# Altium schematic symbol library SCHLIB.SchLib: 2608 symbols (part 20 of 20) (continued)
## TVS-SMBJ33CA-SMB (continued)
footprint D-SMB-DO214AA-CA
pins: A I/O1, C I/O2

## TVS-SMBJ60A
designator TVS?, comment SMBJ60A  Clamping Voltage: 96.8V  Case/Package: SMB
TVS DIODE 60V 96.8V DO214AA; Manufacturer: Littelfuse; Manufacturer Part Number 1: SMBJ6.0A; Peak Pulse Power: 600W; Polarity: Unidirectional; Peak Pulse Current: 6.2A; Test Current: 10mA; Breakdown Voltage: 66.7V; Number of Elements: 1; Leakage Current: 1uA; Min Breakdown Voltage: 6.67V; Max Reverse Leakage Current: 800uA; Element Configuration: Single; Max Power Dissipation: 5W; Max Breakdown Voltage: 7.37V; Power Line Protection: No; Voltage Rating (DC): 6V; Supplier 1: Mouser; Stock 1: 8672; Pricing 1: 1=0,45000, 10=0,19300, 100=0,13000, 1000=0,12600, 3000=0,12500, 9000=0,12500 (USD); RoHS: Yes; Mount: Surface Mount; Number of Pins: 2; Min Operating Temperature: -65°C; Max Operating Temperature: 150°C; Reverse Standoff Voltage: 60V; Packaging: Tape and Reel; Max Surge Current: 6.2A; Package Quantity: 3000; Reverse Breakdown Voltage: 66.7V; Operating Supply Voltage: 60V; Number of Channels: 1; Direction: Unidirectional; Termination: SMD/SMT; Power Dissipation: 600W; Number of Unidirectional Channels: 1; Resistor Type: Zener; Length: 4.57mm; Height: 2.237mm; Width: 3.94mm; Radiation Hardening: No; Lead Free: Lead Free; REACH SVHC: No SVHC; ComponentLink1URL: https://datasheet.ciiva.com/5771/littelfuse-tvs-diode-smbj-5771072.pdf?src-supplier=Farnell; ComponentLink1Description: https://datasheet.ciiva.com/5771/littelfuse-tvs-diode-smbj-5771072.pdf?src-supplier=Farnell; ComponentLink2URL: https://datasheet.ciiva.com/25624/0900766b810f4eeb-25624708.pdf?src-supplier=RSComponents; ComponentLink2Description: https://datasheet.ciiva.com/25624/0900766b810f4eeb-25624708.pdf?src-supplier=RSComponents; ComponentLink3URL: https://datasheet.ciiva.com/15143/getdatasheetpartid-121100-15143582.pdf?src-supplier=Verical; ComponentLink3Description: https://datasheet.ciiva.com/15143/getdatasheetpartid-121100-15143582.pdf?src-supplier=Verical; ComponentLink4URL: https://datasheet.ciiva.com/331/littelfuse-tvs-diode-smbj-datasheet-pdf-331140.pdf?src-supplier=Digi-Key; ComponentLink4Description: https://datasheet.ciiva.com/331/littelfuse-tvs-diode-smbj-datasheet-pdf-331140.pdf?src-supplier=Digi-Key; ComponentLink5URL: https://datasheet.ciiva.com/331/littelfuse-tvs-diode-smbj-datasheet-pdf-331142.pdf?src-supplier=Digi-Key; ComponentLink5Description: https://datasheet.ciiva.com/331/littelfuse-tvs-diode-smbj-datasheet-pdf-331142.pdf?src-supplier=Digi-Key; ComponentLink6URL: https://datasheet.ciiva.com/331/littelfuse-tvs-diode-smbj-datasheet-pdf-331302.pdf?src-supplier=Digi-Key; ComponentLink6Description: https://datasheet.ciiva.com/331/littelfuse-tvs-diode-smbj-datasheet-pdf-331302.pdf?src-supplier=Digi-Key; ComponentLink7URL: https://datasheet.ciiva.com/331/littelfuse-tvs-diode-smbj-datasheet-pdf-331303.pdf?src-supplier=Digi-Key; ComponentLink7Description: https://datasheet.ciiva.com/331/littelfuse-tvs-diode-smbj-datasheet-pdf-331303.pdf?src-supplier=Digi-Key; ComponentLink8URL: https://datasheet.ciiva.com/8062/13057-8062551.pdf?src-supplier=Element14; ComponentLink8Description: https://datasheet.ciiva.com/8062/13057-8062551.pdf?src-supplier=Element14; ComponentLink9URL: https://datasheet.ciiva.com/16389/littelfuse-tvs-diode-smbj-16389079.pdf?src-supplier=Future+Electronics; ComponentLink9Description: https://datasheet.ciiva.com/16389/littelfuse-tvs-diode-smbj-16389079.pdf?src-supplier=Future+Electronics; ComponentLink10URL: https://datasheet.ciiva.com/331/littelfuse-tvs-diode-smbj-datasheet-pdf-331304.pdf?src-supplier=Digi-Key; ComponentLink10Description: https://datasheet.ciiva.com/331/littelfuse-tvs-diode-smbj-datasheet-pdf-331304.pdf?src-supplier=Digi-Key; ComponentLink11URL: https://datasheet.ciiva.com/16395/littelfuse-tvs-diode-smbj-16395752.pdf?src-supplier=Future+Electronics; ComponentLink11Description: https://datasheet.ciiva.com/16395/littelfuse-tvs-diode-smbj-16395752.pdf?src-supplier=Future+Electronics; ComponentLink12URL: https://datasheet.ciiva.com/8062/littelfuse-tvs-diode-smbj-8062345.pdf?src-supplier=Element14; ComponentLink12Description: https://datasheet.ciiva.com/8062/littelfuse-tvs-diode-smbj-8062345.pdf?src-supplier=Element14; ComponentLink13URL: https://datasheet.ciiva.com/4508/littelfuse-tvs-diode-smbj-48653-4508090.pdf?src-supplier=Mouser; ComponentLink13Description: https://datasheet.ciiva.com/4508/littelfuse-tvs-diode-smbj-48653-4508090.pdf?src-supplier=Mouser; ComponentLink14URL: https://datasheet.ciiva.com/4510/littelfuse-tvs-diode-smbj-48653-4510171.pdf?src-supplier=Mouser; ComponentLink14Description: https://datasheet.ciiva.com/4510/littelfuse-tvs-diode-smbj-48653-4510171.pdf?src-supplier=Mouser; ComponentLink15URL: https://datasheet.ciiva.com/14162/smbj-eng-ds-14162044.pdf?src-supplier=Distrelec; ComponentLink15Description: https://datasheet.ciiva.com/14162/smbj-eng-ds-14162044.pdf?src-supplier=Distrelec; ComponentLink16URL: https://datasheet.ciiva.com/8062/littelfuse-tvs-diode-smbj-8062349.pdf?src-supplier=Element14; ComponentLink16Description: https://datasheet.ciiva.com/8062/littelfuse-tvs-diode-smbj-8062349.pdf?src-supplier=Element14; Supplier Part Number 1: 576-SMBJ6.0A
footprint D-SMB-DO214AA
pins: A, C

## TVS-TPD2E2U06QDCKRQ1
designator TVS?, comment TPD2E2U06
TVS DIODE 5.5V 12.4V SC70-3; Manufacturer: Texas Instruments; Manufacturer Part Number: TPD2E2U06QDCKRQ1; Capacitance: 1.5pF; Interface: LVDS,USB,Ethernet; Number of Channels: 2; Supplier 1: Digi-Key; Supplier Part Number 1: 296-44302-1-ND; Stock: 14322; Pricing: 1=0.61, 10=0.49, 100=0.385, 500=0.266, 1000=0.21 (USD); RoHS: No; Min Operating Temperature: -40°C; Max Operating Temperature: 125°C; Lead Free: Lead Free; ComponentLink1URL: http://www.ti.com/general/docs/suppproductinfo.tsp?distId=10&amp;gotoUrl=http%3A%2F%2Fwww.ti.com%2Flit%2Fgpn%2Ftpd2e2u06-q1&src-supplier=Digi-Key; ComponentLink1Description: http://www.ti.com/general/docs/suppproductinfo.tsp?distId=10&amp;gotoUrl=http%3A%2F%2Fwww.ti.com%2Flit%2Fgpn%2Ftpd2e2u06-q1&src-supplier=Digi-Key; ComponentLink2URL: http://www.ti.com/lit/pdf/sszt035?src-supplier=Digi-Key; ComponentLink2Description: http://www.ti.com/lit/pdf/sszt035?src-supplier=Digi-Key
footprint SOT323-3
pins: 1 I/O1, 2 I/O2, 3 GND

## TVS-TPSMB13CA
designator TVS?  Voltage - Breakdown (Min): 12.4V  Package: DO-214AA, SMB
TVS DIODE 11.1VWM 18.2VC DO214AA; Manufacturer Part Number: TPSMB13CA; Manufacturer: Littelfuse Inc.; Bidirectional Channels: 1; Voltage - Reverse Standoff: 11.1V; Voltage - Clamping (Max) @ Ipp: 18.2V; Current - Peak Pulse (10/1000µs): 33.5A; Power - Peak Pulse: 600W; Power Line Protection: No; Object  Type: Part; Design Item ID: TVS-TPSMB13CA; Series: TPSMB; Type: Zener; Applications: Automotive; Operating Temperature: -65°C ~ 175°C (TJ); Mounting Type: Surface Mount; Category: Diode
footprint DO-214AA-SMB
pins: A I/O1, C I/O2

## TVS-TPSMB15CA
designator TVS?  Voltage - Breakdown (Min): 14.3V  Package: DO-214AA, SMB
TVS DIODE 12.8VWM 21.2VC DO214AA; Manufacturer Part Number: TPSMB15CA; Manufacturer: Littelfuse Inc.; Bidirectional Channels: 1; Voltage - Reverse Standoff: 12.8V; Voltage - Clamping (Max) @ Ipp: 21.2V; Current - Peak Pulse (10/1000µs): 28.8A; Power - Peak Pulse: 600W; Power Line Protection: No; Object  Type: Part; Design Item ID: TVS-TPSMB15CA; Series: TPSMB; Type: Zener; Applications: Automotive; Operating Temperature: -65°C ~ 175°C (TJ); Mounting Type: Surface Mount; Category: Diode
footprint DO-214AA-SMB
pins: A I/O1, C I/O2

## TVS-TPSMB16CA
designator TVS?  Voltage - Breakdown (Min): 15.2V  Package: DO-214AA, SMB
TVS DIODE 13.6VWM 22.5VC DO214AA; Manufacturer Part Number: TPSMB16CA; Manufacturer: Littelfuse Inc.; Bidirectional Channels: 1; Voltage - Reverse Standoff: 13.6V; Voltage - Clamping (Max) @ Ipp: 22.5V; Current - Peak Pulse (10/1000µs): 27.1A; Power - Peak Pulse: 600W; Power Line Protection: No; Object  Type: Part; Design Item ID: TVS-TPSMB16CA; Series: TPSMB; Type: Zener; Applications: Automotive; Operating Temperature: -65°C ~ 175°C (TJ); Mounting Type: Surface Mount; Category: Diode
footprint DO-214AA-SMB
pins: A I/O1, C I/O2

## TVS-TPSMB24CA-VR
designator TVS?  Voltage - Breakdown (Min): 26.7V  Package: DO-214AA, SMB
TVS DIODE 24VWM 38.9VC DO214AA; Manufacturer Part Number: TPSMB24CA-VR; Manufacturer: Littelfuse Inc.; Bidirectional Channels: 1; Voltage - Reverse Standoff: 24V; Voltage - Clamping (Max) @ Ipp: 38.9V; Current - Peak Pulse (10/1000µs): 15.5A; Power - Peak Pulse: 600W; Power Line Protection: No; Object  Type: Part; Design Item ID: TVS-TPSMB24CA-VR; Series: TPSMB-VR; Type: Zener; Applications: Automotive; Operating Temperature: -65°C ~ 175°C (TJ); Mounting Type: Surface Mount; Category: Diode
footprint DO-214AA-SMB
pins: A I/O1, C I/O2

## TVS-TPSMB27CA
designator TVS?  Voltage - Breakdown (Min): 25.7V  Package: DO-214AA, SMB
TVS DIODE 23.1VWM 37.5VC DO214AA; Manufacturer Part Number: TPSMB27CA; Manufacturer: Littelfuse Inc.; Bidirectional Channels: 1; Voltage - Reverse Standoff: 23.1V; Voltage - Clamping (Max) @ Ipp: 37.5V; Current - Peak Pulse (10/1000µs): 16.3A; Power - Peak Pulse: 600W; Power Line Protection: No; Object  Type: Part; Design Item ID: TVS-TPSMB27CA; Series: TPSMB; Type: Zener; Applications: Automotive; Operating Temperature: -65°C ~ 175°C (TJ); Mounting Type: Surface Mount; Category: Diode
footprint DO-214AA-SMB
pins: A I/O1, C I/O2

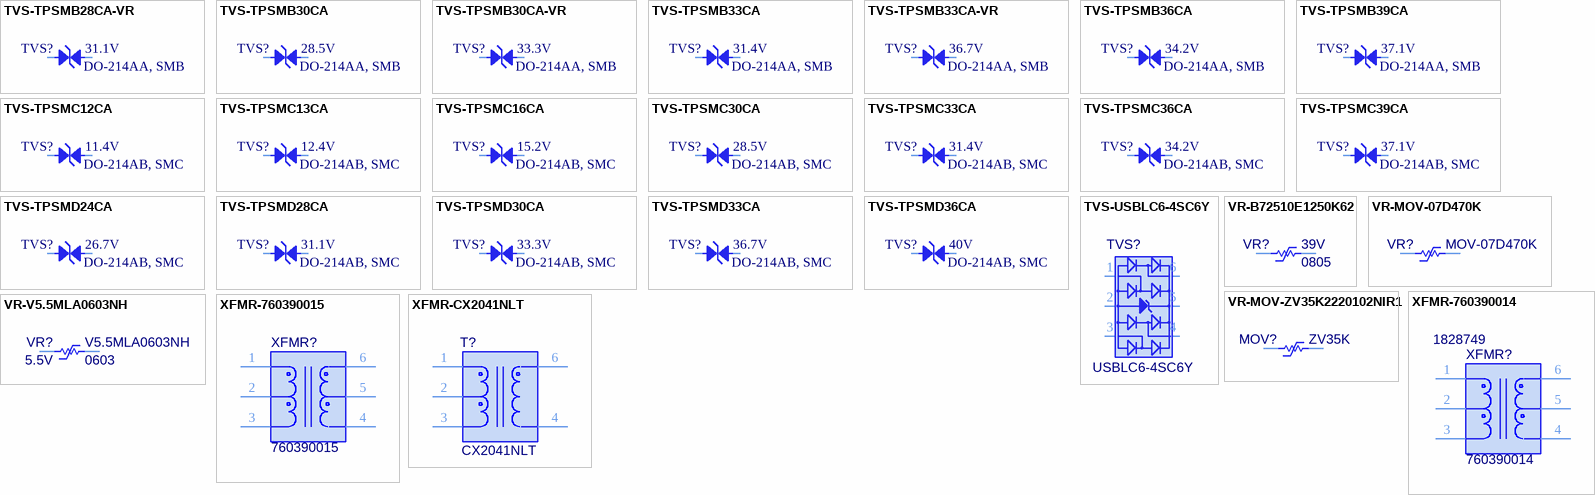
[diagram p83: symbols TVS-TPSMB28CA-VR to XFMR-CX2041NLT]

## TVS-TPSMB28CA-VR
designator TVS?  Voltage - Breakdown (Min): 31.1V  Package: DO-214AA, SMB
TVS DIODE 28VWM 45.4VC DO214 TR; Manufacturer Part Number: TPSMB28CA-VR; Manufacturer: Littelfuse Inc.; Bidirectional Channels: 1; Voltage - Reverse Standoff: 28V; Voltage - Clamping (Max) @ Ipp: 45.4V; Current - Peak Pulse (10/1000µs): 13.3A; Power - Peak Pulse: 600W; Power Line Protection: No; Object  Type: Part; Design Item ID: TVS-TPSMB28CA-VR; Series: TPSMB-VR; Type: Zener; Applications: Automotive; Operating Temperature: -65°C ~ 175°C (TJ); Mounting Type: Surface Mount; Category: Diode
footprint DO-214AA-SMB
pins: A I/O1, C I/O2

## TVS-TPSMB30CA
designator TVS?  Voltage - Breakdown (Min): 28.5V  Package: DO-214AA, SMB
TVS DIODE 25.6VWM 41.4VC DO214AA; Manufacturer Part Number: TPSMB30CA; Manufacturer: Littelfuse Inc.; Bidirectional Channels: 1; Voltage - Reverse Standoff: 25.6V; Voltage - Clamping (Max) @ Ipp: 41.4V; Current - Peak Pulse (10/1000µs): 14.7A; Power - Peak Pulse: 600W; Power Line Protection: No; Object  Type: Part; Design Item ID: TVS-TPSMB30CA; Series: TPSMB; Type: Zener; Applications: Automotive; Operating Temperature: -65°C ~ 175°C (TJ); Mounting Type: Surface Mount; Category: Diode
footprint DO-214AA-SMB
pins: A I/O1, C I/O2

## TVS-TPSMB30CA-VR
designator TVS?  Voltage - Breakdown (Min): 33.3V  Package: DO-214AA, SMB
TVS DIODE 30VWM 48.4VC DO214 TR; Manufacturer Part Number: TPSMB30CA-VR; Manufacturer: Littelfuse Inc.; Bidirectional Channels: 1; Voltage - Reverse Standoff: 30V; Voltage - Clamping (Max) @ Ipp: 48.4V; Current - Peak Pulse (10/1000µs): 12.4A; Power - Peak Pulse: 600W; Power Line Protection: No; Object  Type: Part; Design Item ID: TVS-TPSMB30CA-VR; Series: TPSMB-VR; Type: Zener; Applications: Automotive; Operating Temperature: -65°C ~ 175°C (TJ); Mounting Type: Surface Mount; Category: Diode
footprint DO-214AA-SMB
pins: A I/O1, C I/O2

## TVS-TPSMB33CA
designator TVS?  Voltage - Breakdown (Min): 31.4V  Package: DO-214AA, SMB
TVS DIODE 28.2VWM 45.7VC DO214AA; Manufacturer Part Number: TPSMB33CA; Manufacturer: Littelfuse Inc.; Bidirectional Channels: 1; Voltage - Reverse Standoff: 28.2V; Voltage - Clamping (Max) @ Ipp: 45.7V; Current - Peak Pulse (10/1000µs): 13.3A; Power - Peak Pulse: 600W; Power Line Protection: No; Object  Type: Part; Design Item ID: TVS-TPSMB33CA; Series: TPSMB; Type: Zener; Applications: Automotive; Operating Temperature: -65°C ~ 175°C (TJ); Mounting Type: Surface Mount; Category: Diode
footprint DO-214AA-SMB
pins: A I/O1, C I/O2

## TVS-TPSMB33CA-VR
designator TVS?  Voltage - Breakdown (Min): 36.7V  Package: DO-214AA, SMB
TVS DIODE 33VWM 53.3V DO214AA TR; Manufacturer Part Number: TPSMB33CA-VR; Manufacturer: Littelfuse Inc.; Bidirectional Channels: 1; Voltage - Reverse Standoff: 33V; Current - Peak Pulse (10/1000µs): 11.3A; Power - Peak Pulse: 600W; Power Line Protection: No; Object  Type: Part; Design Item ID: TVS-TPSMB33CA-VR; Series: TPSMB-VR; Type: Zener; Voltage - Clamping (Max) @ Ipp: 53.3V; Applications: Automotive; Operating Temperature: -65°C ~ 175°C (TJ); Mounting Type: Surface Mount; Category: Diode
footprint DO-214AA-SMB
pins: A I/O1, C I/O2

## TVS-TPSMB36CA
designator TVS?  Voltage - Breakdown (Min): 34.2V  Package: DO-214AA, SMB
TVS DIODE 30.8VWM 49.9VC DO214AA; Manufacturer Part Number: TPSMB36CA; Manufacturer: Littelfuse Inc.; Bidirectional Channels: 1; Voltage - Reverse Standoff: 30.8V; Voltage - Clamping (Max) @ Ipp: 49.9V; Current - Peak Pulse (10/1000µs): 12.2A; Power - Peak Pulse: 600W; Power Line Protection: No; Object  Type: Part; Design Item ID: TVS-TPSMB36CA; Series: TPSMB; Type: Zener; Applications: Automotive; Operating Temperature: -65°C ~ 175°C (TJ); Mounting Type: Surface Mount; Category: Diode
footprint DO-214AA-SMB
pins: A I/O1, C I/O2

## TVS-TPSMB39CA
designator TVS?  Voltage - Breakdown (Min): 37.1V  Package: DO-214AA, SMB
TVS DIODE 33.3VWM 53.9VC DO214AA; Manufacturer Part Number: TPSMB39CA; Manufacturer: Littelfuse Inc.; Bidirectional Channels: 1; Voltage - Reverse Standoff: 33.3V; Voltage - Clamping (Max) @ Ipp: 53.9V; Current - Peak Pulse (10/1000µs): 11.3A; Power - Peak Pulse: 600W; Power Line Protection: No; Object  Type: Part; Design Item ID: TVS-TPSMB39CA; Series: TPSMB; Type: Zener; Applications: Automotive; Operating Temperature: -65°C ~ 175°C (TJ); Mounting Type: Surface Mount; Category: Diode
footprint DO-214AA-SMB
pins: A I/O1, C I/O2

## TVS-TPSMC12CA
designator TVS?  Voltage - Breakdown (Min): 11.4V  Package: DO-214AB, SMC
TVS DIODE 10.2VWM 16.7VC DO214AB; Manufacturer Part Number: TPSMC12CA; Manufacturer: Littelfuse Inc.; Bidirectional Channels: 1; Voltage - Reverse Standoff: 10.2V; Voltage - Clamping (Max) @ Ipp: 16.7V; Current - Peak Pulse (10/1000µs): 91A; Power - Peak Pulse: 1500W (1.5kW); Power Line Protection: No; Object  Type: Part; Design Item ID: TVS-TPSMC12CA; Series: TPSMC; Type: Zener; Applications: Automotive; Operating Temperature: -55°C ~ 150°C (TJ); Mounting Type: Surface Mount; Category: Diode
footprint DO-214AB-SMC
pins: A I/O1, C I/O2

## TVS-TPSMC13CA
designator TVS?  Voltage - Breakdown (Min): 12.4V  Package: DO-214AB, SMC
TVS DIODE 11.1VWM 18.2VC DO214AB; Manufacturer Part Number: TPSMC13CA; Manufacturer: Littelfuse Inc.; Bidirectional Channels: 1; Voltage - Reverse Standoff: 11.1V; Voltage - Clamping (Max) @ Ipp: 18.2V; Current - Peak Pulse (10/1000µs): 83.5A; Power - Peak Pulse: 1500W (1.5kW); Power Line Protection: No; Object  Type: Part; Design Item ID: TVS-TPSMC13CA; Series: TPSMC; Type: Zener; Applications: Automotive; Operating Temperature: -55°C ~ 150°C (TJ); Mounting Type: Surface Mount; Category: Diode
footprint DO-214AB-SMC
pins: A I/O1, C I/O2

## TVS-TPSMC16CA
designator TVS?  Voltage - Breakdown (Min): 15.2V  Package: DO-214AB, SMC
TVS DIODE 13.6VWM 22.5VC DO214AB; Manufacturer Part Number: TPSMC16CA; Manufacturer: Littelfuse Inc.; Bidirectional Channels: 1; Voltage - Reverse Standoff: 13.6V; Voltage - Clamping (Max) @ Ipp: 22.5V; Current - Peak Pulse (10/1000µs): 67.6A; Power - Peak Pulse: 1500W (1.5kW); Power Line Protection: No; Object  Type: Part; Design Item ID: TVS-TPSMC16CA; Series: TPSMC; Type: Zener; Applications: Automotive; Operating Temperature: -55°C ~ 150°C (TJ); Mounting Type: Surface Mount; Category: Diode
footprint DO-214AB-SMC
pins: A I/O1, C I/O2

## TVS-TPSMC30CA
designator TVS?  Voltage - Breakdown (Min): 28.5V  Package: DO-214AB, SMC
TVS DIODE 25.6VWM 41.4VC DO214AB; Manufacturer Part Number: TPSMC30CA; Manufacturer: Littelfuse Inc.; Bidirectional Channels: 1; Voltage - Reverse Standoff: 25.6V; Voltage - Clamping (Max) @ Ipp: 41.4V; Current - Peak Pulse (10/1000µs): 36.7A; Power - Peak Pulse: 1500W (1.5kW); Power Line Protection: No; Object  Type: Part; Design Item ID: TVS-TPSMC30CA; Series: TPSMC; Type: Zener; Applications: Automotive; Operating Temperature: -55°C ~ 150°C (TJ); Mounting Type: Surface Mount; Category: Diode
footprint DO-214AB-SMC
pins: A I/O1, C I/O2

## TVS-TPSMC33CA
designator TVS?  Voltage - Breakdown (Min): 31.4V  Package: DO-214AB, SMC
TVS DIODE 28.2VWM 45.7VC DO214AB; Manufacturer Part Number: TPSMC33CA; Manufacturer: Littelfuse Inc.; Bidirectional Channels: 1; Voltage - Reverse Standoff: 28.2V; Voltage - Clamping (Max) @ Ipp: 45.7V; Current - Peak Pulse (10/1000µs): 33.3A; Power - Peak Pulse: 1500W (1.5kW); Power Line Protection: No; Object  Type: Part; Design Item ID: TVS-TPSMC33CA; Series: TPSMC; Type: Zener; Applications: Automotive; Operating Temperature: -55°C ~ 150°C (TJ); Mounting Type: Surface Mount; Category: Diode
footprint DO-214AB-SMC
pins: A I/O1, C I/O2

## TVS-TPSMC36CA
designator TVS?  Voltage - Breakdown (Min): 34.2V  Package: DO-214AB, SMC
TVS DIODE 30.8VWM 49.9VC DO214AB; Manufacturer Part Number: TPSMC36CA; Manufacturer: Littelfuse Inc.; Bidirectional Channels: 1; Voltage - Reverse Standoff: 30.8V; Voltage - Clamping (Max) @ Ipp: 49.9V; Current - Peak Pulse (10/1000µs): 30.5A; Power - Peak Pulse: 1500W (1.5kW); Power Line Protection: No; Object  Type: Part; Design Item ID: TVS-TPSMC36CA; Series: TPSMC; Type: Zener; Applications: Automotive; Operating Temperature: -55°C ~ 150°C (TJ); Mounting Type: Surface Mount; Category: Diode
footprint DO-214AB-SMC
pins: A I/O1, C I/O2

## TVS-TPSMC39CA
designator TVS?  Voltage - Breakdown (Min): 37.1V  Package: DO-214AB, SMC
TVS DIODE 33.3VWM 53.9VC DO214AB; Manufacturer Part Number: TPSMC39CA; Manufacturer: Littelfuse Inc.; Bidirectional Channels: 1; Voltage - Reverse Standoff: 33.3V; Voltage - Clamping (Max) @ Ipp: 53.9V; Current - Peak Pulse (10/1000µs): 28.2A; Power - Peak Pulse: 1500W (1.5kW); Power Line Protection: No; Object  Type: Part; Design Item ID: TVS-TPSMC39CA; Series: TPSMC; Type: Zener; Applications: Automotive; Operating Temperature: -55°C ~ 150°C (TJ); Mounting Type: Surface Mount; Category: Diode
footprint DO-214AB-SMC
pins: A I/O1, C I/O2

## TVS-TPSMD24CA
designator TVS?  Voltage - Breakdown (Min): 26.7V  Package: DO-214AB, SMC
TVS DIODE 24VWM 38.9VC DO214AB; Manufacturer Part Number: TPSMD24CA; Manufacturer: Littelfuse Inc.; Bidirectional Channels: 1; Voltage - Reverse Standoff: 24V; Voltage - Clamping (Max) @ Ipp: 38.9V; Current - Peak Pulse (10/1000µs): 77.1A; Power - Peak Pulse: 3000W (3kW); Power Line Protection: No; Object  Type: Part; Design Item ID: TVS-TPSMD24CA; Series: TPSMD; Type: Zener; Applications: Automotive; Operating Temperature: -65°C ~ 150°C (TJ); Mounting Type: Surface Mount; Category: Diode
footprint DO-214AB-SMC
pins: A I/O1, C I/O2

## TVS-TPSMD28CA
designator TVS?  Voltage - Breakdown (Min): 31.1V  Package: DO-214AB, SMC
TVS DIODE 28VWM 45.4VC DO214AB; Manufacturer Part Number: TPSMD28CA; Manufacturer: Littelfuse Inc.; Bidirectional Channels: 1; Voltage - Reverse Standoff: 28V; Voltage - Clamping (Max) @ Ipp: 45.4V; Current - Peak Pulse (10/1000µs): 66.1A; Power - Peak Pulse: 3000W (3kW); Power Line Protection: No; Object  Type: Part; Design Item ID: TVS-TPSMD28CA; Series: TPSMD; Type: Zener; Applications: Automotive; Operating Temperature: -65°C ~ 150°C (TJ); Mounting Type: Surface Mount; Category: Diode
footprint DO-214AB-SMC
pins: A I/O1, C I/O2

## TVS-TPSMD30CA
designator TVS?  Voltage - Breakdown (Min): 33.3V  Package: DO-214AB, SMC
TVS DIODE 30VWM 48.4VC DO214AB; Manufacturer Part Number: TPSMD30CA; Manufacturer: Littelfuse Inc.; Bidirectional Channels: 1; Voltage - Reverse Standoff: 30V; Voltage - Clamping (Max) @ Ipp: 48.4V; Current - Peak Pulse (10/1000µs): 62A; Power - Peak Pulse: 3000W (3kW); Power Line Protection: No; Object  Type: Part; Design Item ID: TVS-TPSMD30CA; Series: TPSMD; Type: Zener; Applications: Automotive; Operating Temperature: -65°C ~ 150°C (TJ); Mounting Type: Surface Mount; Category: Diode
footprint DO-214AB-SMC
pins: A I/O1, C I/O2

## TVS-TPSMD33CA
designator TVS?  Voltage - Breakdown (Min): 36.7V  Package: DO-214AB, SMC
TVS DIODE 33VWM 53.3VC DO214AB; Manufacturer Part Number: TPSMD33CA; Manufacturer: Littelfuse Inc.; Bidirectional Channels: 1; Voltage - Reverse Standoff: 33V; Voltage - Clamping (Max) @ Ipp: 53.3V; Current - Peak Pulse (10/1000µs): 56.3A; Power - Peak Pulse: 3000W (3kW); Power Line Protection: No; Object  Type: Part; Design Item ID: TVS-TPSMD33CA; Series: TPSMD; Type: Zener; Applications: Automotive; Operating Temperature: -65°C ~ 150°C (TJ); Mounting Type: Surface Mount; Category: Diode
footprint DO-214AB-SMC
pins: A I/O1, C I/O2

## TVS-TPSMD36CA
designator TVS?  Voltage - Breakdown (Min): 40V  Package: DO-214AB, SMC
TVS DIODE 36VWM 58.1VC DO214AB; Manufacturer Part Number: TPSMD36CA; Manufacturer: Littelfuse Inc.; Bidirectional Channels: 1; Voltage - Reverse Standoff: 36V; Voltage - Clamping (Max) @ Ipp: 58.1V; Current - Peak Pulse (10/1000µs): 51.6A; Power - Peak Pulse: 3000W (3kW); Power Line Protection: No; Object  Type: Part; Design Item ID: TVS-TPSMD36CA; Series: TPSMD; Type: Zener; Applications: Automotive; Operating Temperature: -65°C ~ 175°C (TJ); Mounting Type: Surface Mount; Category: Diode
footprint DO-214AB-SMC
pins: A I/O1, C I/O2

## TVS-USBLC6-4SC6Y
designator TVS?, comment USBLC6-4SC6Y
TVS DIODE 5.25V 17V SOT23-6; Manufacturer: STMicroelectronics; Direction: Unidirectional; Capacitance: 4pF; Min Breakdown Voltage: 6V; Power Line Protection: Yes; Leakage Current: 150nA; Peak Pulse Current: 5A; Number of Bidirectional Channels: 4; Supplier 1: Digi-Key; Supplier Part Number 1: 497-11883-1-ND; Manufacturer Part Number: USBLC6-4SC6Y; Stock: 26750; Pricing: 1=0.87, 10=0.737, 100=0.5762, 500=0.469, 1000=0.3752 (USD); RoHS: Yes; Mount: Surface Mount; Case/Package: SOT-23-6; Number of Pins: 6; Min Operating Temperature: -40°C; Max Operating Temperature: 150°C; Clamping Voltage: 17V; Package Quantity: 1; Packaging: Tape and Reel; Reverse Standoff Voltage: 5.25V; Length: 3mm; Depth: 1.75mm; Radiation Hardening: No; Lead Free: Lead Free; ComponentLink1URL: https://datasheet.ciiva.com/25956/dm00055251-25956716.pdf?src-supplier=Avnet+Europe; ComponentLink1Description: https://datasheet.ciiva.com/25956/dm00055251-25956716.pdf?src-supplier=Avnet+Europe; ComponentLink2URL: https://datasheet.ciiva.com/339/dm00055251-339152.pdf?src-supplier=Digi-Key; ComponentLink2Description: https://datasheet.ciiva.com/339/dm00055251-339152.pdf?src-supplier=Digi-Key; ComponentLink3URL: https://datasheet.ciiva.com/339/dm00055251-339153.pdf?src-supplier=Digi-Key; ComponentLink3Description: https://datasheet.ciiva.com/339/dm00055251-339153.pdf?src-supplier=Digi-Key; ComponentLink4URL: https://datasheet.ciiva.com/339/dm00055251-339154.pdf?src-supplier=Digi-Key; ComponentLink4Description: https://datasheet.ciiva.com/339/dm00055251-339154.pdf?src-supplier=Digi-Key
footprint SOT23-6L
pins: 1 I/O1, 2 GND, 3 I/O2, 4 I/O3, 5 VDD, 6 I/O4

## VR-B72510E1250K62
designator VR?, comment Varistor Voltage: 39V  Case Code (Imperial): 0805  (hidden comment: B72510E1250K62)
VARISTOR 39V 80A 0805; Manufacturer: TDK EPCOS; Capacitance: 250pF; Max Voltage Rating (AC): 25V; Max Voltage Rating (DC): 31V; Clamping Voltage: 67V; Clamping Current: 1A; Voltage Tolerance: 10%; Number of Circuits: 1; Energy: 0.3J; Min Varistor Voltage: 35.1V; Max Varistor Voltage: 42.9V; Washability: OK; Supplier 1: Digi-Key; Manufacturer Part Number: B72510E1250K62; Stock 1: 0; Mount: Surface Mount; Case/Package: 0805; Case Code (Metric): 2012; Min Operating Temperature: -55°C; Max Operating Temperature: 125°C; Max Surge Current: 80A; Packaging: Tape and Reel; Package Quantity: 1; Voltage Rating (DC): 31V; Voltage Rating (AC): 25V; Tolerance: 10%; Termination: SMD/SMT; Length: 2mm; Depth: 1.25mm; ComponentLink1URL: http://www.mouser.com/ds/2/400/Automotive_series-525688.pdf; ComponentLink1Description: http://www.mouser.com/ds/2/400/Automotive_series-525688.pdf; Supplier Part Number 1: 495-4614-1-ND
footprint R-0805
pins: 1, 2

## VR-MOV-07D470K
designator VR?, comment MOV-07D470K
VARISTOR 47V 250A DISC 7MM; Manufacturer: Bourns; Capacitance: 1.1nF; Max Voltage Rating (DC): 38V; Max Voltage Rating (AC): 30V; Clamping Current: 2.5A; Voltage Rating (DC): 52V; Tolerance: 10%; Clamping Voltage: 93V; Number of Circuits: 1; Energy: 2.5J; Min Varistor Voltage: 42V; Lead/Base Style: Radial; Washability: OK; Supplier 1: Mouser; Manufacturer Part Number: MOV-07D470K; Stock 1: 2133; Pricing 1: 1=0.44, 10=0.245, 50=0.245, 100=0.185, 1000=0.08, 10000=0.052 (USD); Mount: Radial,Through Hole; Case/Package: Radial; Min Operating Temperature: -40°C; Max Operating Temperature: 85°C; Varistor Voltage: 47V; Packaging: Bulk; Max Surge Current: 250A; Package Quantity: 2000; Voltage Tolerance: 10%; Max Varistor Voltage: 52V; Voltage Rating (AC): 30V; Diameter: 7mm; Width: 6.8mm; Lead Pitch: 5mm; Depth: 3.8mm; Radiation Hardening: No; REACH SVHC: No SVHC; ComponentLink1URL: http://www.bourns.com/data/global/pdfs/MOV07D.pdf?src-supplier=Avnet; ComponentLink1Description: http://www.bourns.com/data/global/pdfs/MOV07D.pdf?src-supplier=Avnet; ComponentLink2URL: http://www.bourns.com/data/global/pdfs/MOV07D.pdf?src-supplier=Avnet+Europe; ComponentLink2Description: http://www.bourns.com/data/global/pdfs/MOV07D.pdf?src-supplier=Avnet+Europe; ComponentLink3URL: https://www.bourns.com/docs/Product-Datasheets/MOV07D.pdf?src-supplier=Digi-Key; ComponentLink3Description: https://www.bourns.com/docs/Product-Datasheets/MOV07D.pdf?src-supplier=Digi-Key; Supplier Part Number 1: 652-MOV-07D470K
footprint VRS-7mm
pins: 1, 2

## VR-MOV-ZV35K2220102NIR1
designator MOV?, comment ZV35K
ZV 35V 10% 2220 NI SN; Manufacturer: Bourns; Manufacturer Part Number: ZV35K2220102NIR1; Supplier 1: Digi-Key; Supplier Part Number 1: 118-ZV35K2220102NIR1CT-ND; Stock: 963; Pricing: 1=0.92, 10=0.809, 25=0.716, 100=0.6237, 250=0.5428, 500=0.462 (USD)
footprint VR-2220 (2220, 2-Leads, Body 9.4x5.7mm, Pitch 6.7mm)
pins: 1, 2

## VR-V5.5MLA0603NH
designator VR?, comment V5.5MLA0603NH  Max Voltage Rating (DC): 5.5V  Case/Package: 0603
VARISTOR 8.2V 30A 0603; Manufacturer: Littelfuse; Number of Circuits: 1; Energy: 0.1J; Clamping Current: 1A; Voltage Rating (AC): 4V; Capacitance: 500pF; Min Varistor Voltage: 7.1V; Varistor Voltage: 9.3V; Clamping Voltage: 17.5V; Supplier 1: Digi-Key; Supplier Part Number 1: F3363CT-ND; Manufacturer Part Number: V5.5MLA0603NH; Stock: 17828; Pricing: 1=0.48, 10=0.407, 25=0.3564, 100=0.3056, 250=0.2649, 500=0.2241, 1000=0.1732 (USD); RoHS: Yes; Mount: Surface Mount; Case Code (Metric): 1608; Case Code (Imperial): 0603; Min Operating Temperature: -55°C; Max Operating Temperature: 125°C; Termination: SMD/SMT; Voltage Rating (DC): 5.5V; Max Surge Current: 30A; Package Quantity: 1; Packaging: Tape and Reel; Max Varistor Voltage: 9.3V; Voltage Rating: 5.5V; Max Output Current: 30A; Length: 1.6mm; Depth: 0.8mm; Width: 0.8mm; Thickness: 1mm; Lead Free: Lead Free; REACH SVHC: No SVHC; ComponentLink1URL: https://datasheet.ciiva.com/25604/0900766b8110fc50-25604612.pdf?src-supplier=RSComponents; ComponentLink1Description: https://datasheet.ciiva.com/25604/0900766b8110fc50-25604612.pdf?src-supplier=RSComponents; ComponentLink2URL: https://datasheet.ciiva.com/28500/771777-28500998.pdf?src-supplier=Element14; ComponentLink2Description: https://datasheet.ciiva.com/28500/771777-28500998.pdf?src-supplier=Element14; ComponentLink3URL: https://datasheet.ciiva.com/15155/getdatasheetpartid-152319-15155610.pdf?src-supplier=Verical; ComponentLink3Description: https://datasheet.ciiva.com/15155/getdatasheetpartid-152319-15155610.pdf?src-supplier=Verical; ComponentLink4URL: https://datasheet.ciiva.com/365/littelfuse-mlv-mla-365235.pdf?src-supplier=Digi-Key; ComponentLink4Description: https://datasheet.ciiva.com/365/littelfuse-mlv-mla-365235.pdf?src-supplier=Digi-Key; ComponentLink5URL: https://datasheet.ciiva.com/365/littelfuse-mlv-mla-365236.pdf?src-supplier=Digi-Key; ComponentLink5Description: https://datasheet.ciiva.com/365/littelfuse-mlv-mla-365236.pdf?src-supplier=Digi-Key; ComponentLink6URL: https://datasheet.ciiva.com/365/littelfuse-mlv-mla-365237.pdf?src-supplier=Digi-Key; ComponentLink6Description: https://datasheet.ciiva.com/365/littelfuse-mlv-mla-365237.pdf?src-supplier=Digi-Key; ComponentLink7URL: https://datasheet.ciiva.com/8070/575651-8070855.pdf?src-supplier=Element14; ComponentLink7Description: https://datasheet.ciiva.com/8070/575651-8070855.pdf?src-supplier=Element14; ComponentLink8URL: https://datasheet.ciiva.com/22712/575651-22712073.pdf?src-supplier=Element14; ComponentLink8Description: https://datasheet.ciiva.com/22712/575651-22712073.pdf?src-supplier=Element14; ComponentLink9URL: https://datasheet.ciiva.com/16378/littelfuse-ml-16378604.pdf?src-supplier=Future+Electronics; ComponentLink9Description: https://datasheet.ciiva.com/16378/littelfuse-ml-16378604.pdf?src-supplier=Future+Electronics; ComponentLink10URL: https://datasheet.ciiva.com/4540/littelfuse-varistor-mla-datasheet-pdf-357296-4540222.pdf?src-supplier=Mouser; ComponentLink10Description: https://datasheet.ciiva.com/4540/littelfuse-varistor-mla-datasheet-pdf-357296-4540222.pdf?src-supplier=Mouser; Max Voltage Rating (AC): 4V
footprint R-0603
pins: 1, 2

## XFMR-760390014
designator XFMR?, comment 760390014  Supplier Part Number 1: 1828749
TRANSFORMER 475UH SMD; Manufacturer: Wurth Electronics; Frequency: 10kHz; DC Resistance (DCR): 370mR; Current Rating: 150mA; Isolation Voltage: 2.5kV; Supplier 1: RSComponents; Manufacturer Part Number: 760390014; Stock 1: 3780; Pricing 1: 1200=1.99200, 1200=15.32500 (EUR); RoHS: Yes; Mount: Surface Mount; Case/Package: SMD/SMT; Min Operating Temperature: -40°C; Max Operating Temperature: 125°C; Package Quantity: 1200; Packaging: Tape and Reel; Termination: SMD/SMT; Inductance: 475uH; Max DC Current: 150mA; Length: 10.05mm; Width: 10.05mm; Height: 4.19mm; Height - Seated (Max): 4.19mm; ComponentLink1URL: https://datasheet.ciiva.com/12335/760390014-221199-12335395.pdf?src-supplier=Mouser; ComponentLink1Description: https://datasheet.ciiva.com/12335/760390014-221199-12335395.pdf?src-supplier=Mouser
footprint T-760390015 (760390015)
pins: 1, 2, 3, 4, 5, 6

## XFMR-760390015
designator XFMR?, comment 760390015
TRANSFORMER 475UH SMD; Manufacturer: Wurth Electronics; DC Resistance (DCR): 570mR; Frequency: 10kHz; Isolation Voltage: 2.5kV; Max DC Current: 150mA; Supplier 1: RSComponents; Manufacturer Part Number: 760390015; Stock 1: 35; Pricing 1: 5=2,20700, 25=2,05100, 100=1,93700, 250=1,86900, 500=1,74700, 5=16,98000, 25=15,78000, 100=14,90000, 250=14,38000, 500=13,44000 (EUR); RoHS: Yes; Mount: Surface Mount; Case/Package: SMD/SMT; Min Operating Temperature: -40°C; Max Operating Temperature: 125°C; Package Quantity: 1200; Termination: SMD/SMT; Packaging: Tape and Reel; Inductance: 475uH; Current Rating: 150mA; Length: 10.05mm; Height: 4.19mm; Width: 10.05mm; Height - Seated (Max): 4.19mm; ComponentLink1URL: https://datasheet.ciiva.com/12335/760390015-221218-12335392.pdf?src-supplier=Mouser; ComponentLink1Description: https://datasheet.ciiva.com/12335/760390015-221218-12335392.pdf?src-supplier=Mouser; Supplier Part Number 1: 1828986
footprint T-760390015 (760390015)
pins: 1, 2, 3, 4, 5, 6

## XFMR-CX2041NLT
designator T?, comment CX2041NLT
BALUN 50KHZ-450MHZ 75/75 5SMD; Manufacturer: Pulse; Insertion Loss: 0.6dB; Frequency: 1.5GHz; Turns Ratio: 1:1; Washability: OK; Supplier 1: Digi-Key; Supplier Part Number 1: 553-2290-1-ND; Manufacturer Part Number: CX2041NLT; Stock: 5174; Pricing: 1=2.97, 10=2.376, 25=1.9304, 50=1.881, 100=1.8315, 250=1.782, 500=1.7672, 1000=1.5642 (USD); RoHS: Yes; Mount: Surface Mount; Case/Package: SMD/SMT; Number of Pins: 5; Min Operating Temperature: -40°C; Max Operating Temperature: 85°C; Packaging: Tape and Reel; Package Quantity: 2000; Length: 3.81mm; Depth: 3.81mm; Radiation Hardening: No; ComponentLink1URL: https://datasheet.ciiva.com/2788/+c203-2788942.pdf?src-supplier=Digi-Key; ComponentLink1Description: https://datasheet.ciiva.com/2788/+c203-2788942.pdf?src-supplier=Digi-Key
footprint T-CX2041NL
pins: 1, 2, 3, 4, 6